# Altium footprint library WE Inductors.PcbLib: 131 footprints (part 3 of 9)
Each footprint in its own frame and in the unit in brackets; x right, y up, seen from the top. Pads: shape width x height; smd on the part's side, far side on the other; paste and mask are expansions set on the pad; w line width, h text height; cw(c..) or ccw(c..) is an arc to the next point about the centre after c.
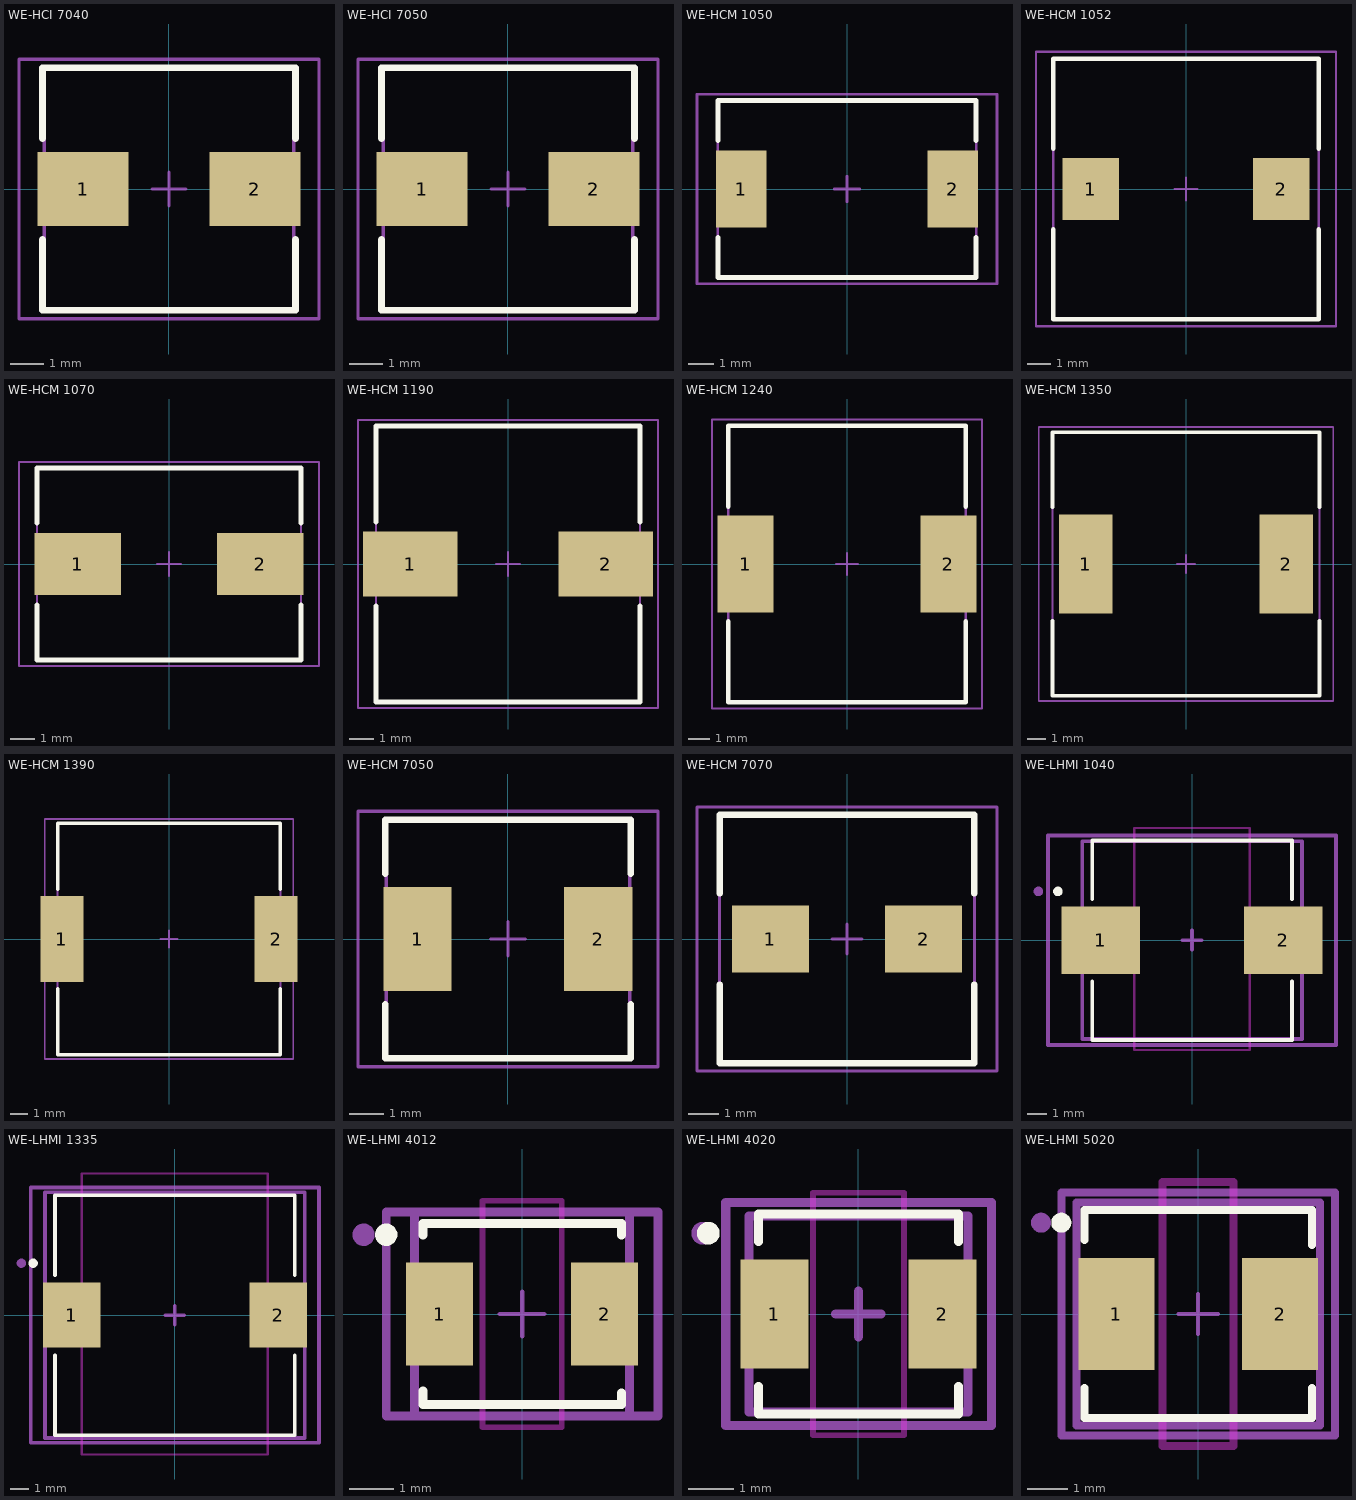
[diagram p2: the footprints below, top view; thin cyan lines are the x and y axes]

## WE-HCI 7040 [mm] "SMD Inductor, 2-Leads, Body 7,0x6,9mm"
height 4
pads (2):
  rect 2.7x2.2 smd: 1(-2.55,0) 2(2.55,0)
Top Overlay:
  lines w0.2: -3.75,-1.5 -3.75,-3.6 3.75,-3.6 3.75,-1.5 ; -3.75,1.5 -3.75,3.6 3.75,3.6 3.75,1.5
Mechanical 13:
  lines w0.1: -3.7,-3.6 3.7,-3.6 3.7,3.6 -3.7,3.6 -3.7,-3.6
Mechanical 15:
  lines w0.1: -0.5,0 0.5,0 ; 0,-0.5 0,0.5 ; -4.45,-3.85 4.45,-3.85 4.45,3.85 -4.45,3.85 -4.45,-3.85
  text ".Designator" at 0,0 h0.76
3D body: height 4, standoff 0, extent -3.5,-3.45 3.5,3.45

## WE-HCI 7050 [mm] "SMD Inductor, 2-Leads, Body 7,0x6,9mm"
height 5
pads (2):
  rect 2.7x2.2 smd: 1(-2.55,0) 2(2.55,0)
Top Overlay:
  lines w0.2: -3.75,-1.5 -3.75,-3.6 3.75,-3.6 3.75,-1.5 ; -3.75,1.5 -3.75,3.6 3.75,3.6 3.75,1.5
Mechanical 13:
  lines w0.1: -3.7,-3.6 -3.7,3.6 3.7,3.6 3.7,-3.6 -3.7,-3.6
Mechanical 15:
  lines w0.1: -0.5,0 0.5,0 ; 0,-0.5 0,0.5 ; -4.45,-3.85 -4.45,3.85 4.45,3.85 4.45,-3.85 -4.45,-3.85
  text ".Designator" at 0,0 h0.76
3D body: height 4.98, standoff -0.02, extent -3.5,-3.45 3.5,3.45

## WE-HCM 1050 [mm] "SMD Inductor, 2-Leads, Body 10,2x7,0mm"
height 5
pads (2):
  rect 2x3.05 smd: 1(-4.175,0) 2(4.175,0)
Top Overlay:
  lines w0.2: -5.1,-1.925 -5.1,-3.5 5.1,-3.5 5.1,-1.925 ; -5.1,1.925 -5.1,3.5 5.1,3.5 5.1,1.925
Mechanical 13:
  lines w0.1: -5.1,-3.5 5.1,-3.5 5.1,3.5 -5.1,3.5 -5.1,-3.5
Mechanical 15:
  lines w0.1: -0.5,0 0.5,0 ; 0,-0.5 0,0.5 ; -5.925,-3.75 5.925,-3.75 5.925,3.75 -5.925,3.75 -5.925,-3.75
3D body: height 4.98, standoff -0.02, extent -5.1,-3.5 5.1,3.5

## WE-HCM 1052 [mm] "SMD Inductor, 2-Leads, Body 10,5x10,3mm"
height 5.2
pads (2):
  rect 2.45x2.7 smd: 1(-4.125,0) 2(4.125,0)
Top Overlay:
  lines w0.2: -5.75,-1.75 -5.75,-5.65 5.75,-5.65 5.75,-1.75 ; -5.75,1.75 -5.75,5.65 5.75,5.65 5.75,1.75
Mechanical 13:
  lines w0.1: -5.75,-5.65 -5.75,5.65 5.75,5.65 5.75,-5.65 -5.75,-5.65
Mechanical 15:
  lines w0.1: -0.5,0 0.5,0 ; 0,-0.5 0,0.5 ; -6.5,-5.95 -6.5,5.95 6.5,5.95 6.5,-5.95 -6.5,-5.95
3D body: height 4.99, standoff -0.01, extent -5.25,-5.15 5.25,5.15

## WE-HCM 1070 [mm] "SMD Inductor, 2-Leads, Body 10,5x7,6mm"
height 7.2
pads (2):
  rect 3.6x2.6 smd: 1(-3.8,0) 2(3.8,0)
Top Overlay:
  lines w0.2: -5.5,-1.7 -5.5,-4 5.5,-4 5.5,-1.7 ; -5.5,1.7 -5.5,4 5.5,4 5.5,1.7
Mechanical 13:
  lines w0.1: -5.5,-4 -5.5,4 5.5,4 5.5,-4 -5.5,-4
Mechanical 15:
  lines w0.1: -0.5,0 0.5,0 ; 0,-0.5 0,0.5 ; -6.25,-4.25 -6.25,4.25 6.25,4.25 6.25,-4.25 -6.25,-4.25
3D body: height 6.99, standoff -0.01, extent -5.1,-3.8 5.1,3.8

## WE-HCM 1190 [mm] "SMD Inductor, 2-Leads, Body 10,50x11,00mm,"
height 9.4
pads (2):
  rect 3.95x2.7 smd: 1(-4.075,0) 2(4.075,0)
Top Overlay:
  lines w0.2: -5.5,-1.75 -5.5,-5.75 5.5,-5.75 5.5,-1.75 ; -5.5,1.75 -5.5,5.75 5.5,5.75 5.5,1.75
Mechanical 13:
  lines w0.1: -5.5,-5.75 -5.5,5.75 5.5,5.75 5.5,-5.75 -5.5,-5.75
Mechanical 15:
  lines w0.1: -0.5,0 0.5,0 ; 0,-0.5 0,0.5 ; -6.25,-6 -6.25,6 6.25,6 6.25,-6 -6.25,-6
3D body: height 8.9, standoff 0, extent -5.65,-5.5 5.65,5.5

## WE-HCM 1240 [mm] "SMd Inductor, 2-Leads, Body 10,0x11,8mm"
height 4
pads (2):
  rect 2.6x4.5 smd: 1(-4.7,0) 2(4.7,0)
Top Overlay:
  lines w0.2: -5.5,-2.65 -5.5,-6.4 5.5,-6.4 5.5,-2.65 ; -5.5,2.65 -5.5,6.4 5.5,6.4 5.5,2.65
Mechanical 13:
  lines w0.1: -5.5,-6.4 -5.5,6.4 5.5,6.4 5.5,-6.4 -5.5,-6.4
Mechanical 15:
  lines w0.1: -0.5,0 0.5,0 ; 0,-0.5 0,0.5 ; -6.25,-6.7 -6.25,6.7 6.25,6.7 6.25,-6.7 -6.25,-6.7
3D body: height 3.79, standoff -0.01, extent -5.75,-5.65 5.75,5.65

## WE-HCM 1350 [mm] "SMD Inductor, 2-Leads, Body 13,5x13,3mm"
height 5.2
pads (2):
  rect 2.9x5.4 smd: 1(-5.45,0) 2(5.45,0)
Top Overlay:
  lines w0.2: -7.25,-3.1 -7.25,-7.15 7.25,-7.15 7.25,-3.1 ; -7.25,3.1 -7.25,7.15 7.25,7.15 7.25,3.1
Mechanical 13:
  lines w0.1: -7.25,-7.15 7.25,-7.15 7.25,7.15 -7.25,7.15 -7.25,-7.15
Mechanical 15:
  lines w0.1: -0.5,0 0.5,0 ; 0,-0.5 0,0.5 ; -8,-7.45 8,-7.45 8,7.45 -8,7.45 -8,-7.45
3D body: height 4.98, standoff -0.02, extent -6.75,-6.65 6.75,6.65

## WE-HCM 1390 [mm] "SMD Inductor, 2-Leads, Body 12,50x13,00mm"
height 9.5
pads (2):
  rect 2.5x5 smd: 1(-6.25,0) 2(6.25,0)
Top Overlay:
  lines w0.2: -6.5,-2.9 -6.5,-6.75 6.5,-6.75 6.5,-2.9 ; -6.5,2.9 -6.5,6.75 6.5,6.75 6.5,2.9
Mechanical 13:
  lines w0.1: -6.5,-6.75 -6.5,6.75 6.5,6.75 6.5,-6.75 -6.5,-6.75
Mechanical 15:
  lines w0.1: -0.5,0 0.5,0 ; 0,-0.5 0,0.5 ; -7.25,-7 -7.25,7 7.25,7 7.25,-7 -7.25,-7
3D body: height 8.95, standoff -0.05, extent -7,-6.5 7,6.5

## WE-HCM 7050 [mm] "SMD Inductor, 2-Leads, Body 7,2x7,0mm"
height 5
pads (2):
  rect 2x3.05 smd: 1(-2.65,0) 2(2.65,0)
Top Overlay:
  lines w0.2: -3.6,-1.925 -3.6,-3.5 3.6,-3.5 3.6,-1.925 ; -3.6,1.925 -3.6,3.5 3.6,3.5 3.6,1.925
Mechanical 13:
  lines w0.1: -3.575,-3.5 -3.575,3.5 3.575,3.5 3.575,-3.5 -3.575,-3.5
Mechanical 15:
  lines w0.1: -0.5,0 0.5,0 ; 0,-0.5 0,0.5 ; -4.4,-3.75 -4.4,3.75 4.4,3.75 4.4,-3.75 -4.4,-3.75
3D body: height 4.74, standoff -0.02, extent -3.575,-3.5 3.575,3.5

## WE-HCM 7070 [mm] "SMD Inductor, 2-Leads, Body 7,4x7,2mm"
height 7.2
pads (2):
  rect 2.55x2.2 smd: 1(-2.525,0) 2(2.525,0)
Top Overlay:
  lines w0.2: -4.2,-1.5 -4.2,-4.1 4.2,-4.1 4.2,-1.5 ; -4.2,1.5 -4.2,4.1 4.2,4.1 4.2,1.5
Mechanical 13:
  lines w0.1: -4.2,-4.1 -4.2,4.1 4.2,4.1 4.2,-4.1 -4.2,-4.1
Mechanical 15:
  lines w0.1: -0.5,0 0.5,0 ; 0,-0.5 0,0.5 ; -4.95,-4.35 -4.95,4.35 4.95,4.35 4.95,-4.35 -4.95,-4.35
3D body: height 6.98, standoff -0.02, extent -3.7,-3.6 3.7,3.6

## WE-LHMI 1040 [mm] "SMD Inductor, 2-Leads, Body 11 x 10mm"
height 3.8
pads (2):
  rect 4.1x3.5 smd: 1(-4.75,0) 2(4.75,0)
Top Overlay:
  circle w0.25: c-6.985,2.54 r0.125
  lines w0.2: -5.2,-2.15 -5.2,-5.2 5.2,-5.2 5.2,-2.15 ; -5.2,2.15 -5.2,5.2 5.2,5.2 5.2,2.15
Keep-Out Layer:
  lines w0.127: -3,-5.715 -3,5.842 3,5.842 3,-5.715 -3,-5.715
Mechanical 13:
  lines w0.2: -5.715,-5.15 -5.715,5.15 5.715,5.15 5.715,-5.15 -5.715,-5.15
Mechanical 15:
  circle w0.25: c-8.001,2.54 r0.125
  lines w0.2: -0.5,0 0.5,0 ; 0,-0.5 0,0.5 ; -7.493,-5.45 -7.493,5.45 7.493,5.45 7.493,-5.45 -7.493,-5.45
  text ".Designator" at 0,0 h0.76
3D body: height 3.8, standoff 0, extent -5.5,-5 5.5,5

## WE-LHMI 1335 [mm] "SMD Inductor, 2-Leads, Body 13.5 x 12.6mm"
height 3.3
pads (2):
  rect 3.1x3.5 smd: 1(-5.55,0) 2(5.55,0)
Top Overlay:
  circle w0.25: c-7.62,2.794 r0.125
  lines w0.2: -6.45,-2.15 -6.45,-6.45 6.45,-6.45 6.45,-2.15 ; -6.45,2.15 -6.45,6.45 6.45,6.45 6.45,2.15
Keep-Out Layer:
  lines w0.127: -5,-7.493 5,-7.493 5,7.62 -5,7.62 -5,-7.493
Mechanical 13:
  lines w0.2: -6.985,-6.604 -6.985,6.604 6.985,6.604 6.985,-6.604 -6.985,-6.604
Mechanical 15:
  circle w0.25: c-8.255,2.794 r0.125
  lines w0.2: -0.5,0 0.5,0 ; 0,-0.5 0,0.5 ; -7.747,-6.858 7.747,-6.858 7.747,6.858 -7.747,6.858 -7.747,-6.858
  text ".Designator" at 0,0 h0.76
3D body: height 3.3, standoff 0, extent -6.75,-6.3 6.75,6.3

## WE-LHMI 4012 [mm] "SMD Inductor, 2-Leads, Body 4.45x 4.06mm"
height 1
pads (2):
  rect 1.5x2.3 smd: 1(-1.85,0) 2(1.85,0)
Top Overlay:
  circle w0.25: c-3.048,1.778 r0.125
  lines w0.2: -2.225,-1.725 -2.225,-2.03 2.225,-2.03 2.225,-1.775 ; -2.225,1.775 -2.225,2.03 2.225,2.03 2.225,1.775
Keep-Out Layer:
  lines w0.127: -0.889,-2.54 -0.889,2.54 0.889,2.54 0.889,-2.54 -0.889,-2.54
Mechanical 13:
  lines w0.2: -2.413,-2.286 2.413,-2.286 2.413,2.286 -2.413,2.286 -2.413,-2.286
Mechanical 15:
  circle w0.25: c-3.556,1.778 r0.125
  lines w0.1: -0.5,0 0.5,0 ; 0,-0.5 0,0.5
  lines w0.2: -3.048,-2.286 -3.048,2.286 3.048,2.286 3.048,-2.286 -3.048,-2.286
  text ".Designator" at 0,0 h0.76
3D body: height 1, standoff 0, extent -2.225,-2.03 2.225,2.03

## WE-LHMI 4020 [mm] "SMD Inductor, 2-Leads, Body 4.45 x 4.06mm"
height 1.8
pads (2):
  rect 1.5x2.4 smd: 1(-1.85,0) 2(1.85,0)
Top Overlay:
  circle w0.25: c-3.304,1.778 r0.125
  lines w0.2: -2.2,-1.6 -2.2,-2.2 2.2,-2.2 2.2,-1.6 ; -2.2,1.6 -2.2,2.2 2.2,2.2 2.2,1.6
Keep-Out Layer:
  lines w0.127: -1,-2.667 1,-2.667 1,2.667 -1,2.667 -1,-2.667
Mechanical 13:
  lines w0.2: -2.413,-2.155 2.413,-2.155 2.413,2.155 -2.413,2.155 -2.413,-2.155
Mechanical 15:
  circle w0.25: c-3.429,1.778 r0.125
  lines w0.2: -0.5,0 0.5,0 ; 0,-0.5 0,0.5 ; -2.921,-2.45 2.925,-2.45 2.925,2.45 -2.921,2.45 -2.921,-2.45
  text ".Designator" at 0,0 h0.76
3D body: height 1.8, standoff 0, extent -2.225,-2.03 2.225,2.03

## WE-LHMI 5020 [mm] "SMD Inductor, 2-Leads, Body 5.7x 5.2mm"
height 1.8
pads (2):
  rect 1.9x2.8 smd: 1(-2.05,0) 2(2.05,0)
Top Overlay:
  circle w0.25: c-3.429,2.286 r0.125
  lines w0.2: -2.85,-1.849 -2.85,-2.6 2.85,-2.6 2.85,-1.849 ; -2.85,1.849 -2.85,2.6 2.85,2.6 2.85,1.722
Keep-Out Layer:
  lines w0.2: -0.889,-3.302 0.889,-3.302 0.889,3.302 -0.889,3.302 -0.889,-3.302
Mechanical 13:
  lines w0.2: -3.048,-2.794 -3.048,2.794 3.048,2.794 3.048,-2.794 -3.048,-2.794
Mechanical 15:
  circle w0.25: c-3.937,2.286 r0.125
  lines w0.1: -0.5,0 0.5,0 ; 0,-0.5 0,0.5
  lines w0.2: -3.429,-3.048 3.429,-3.048 3.429,3.048 -3.429,3.048 -3.429,-3.048
  text ".Designator" at 0,0 h0.76
3D body: height 1.8, standoff 0, extent -2.85,-2.6 2.85,2.6